# Altium footprint library 集大电协1.5.PcbLib: 227 footprints (part 10 of 18)
Each footprint in its own frame and in the unit in brackets; x right, y up, seen from the top. Pads: shape width x height; smd on the part's side, far side on the other; paste and mask are expansions set on the pad; w line width, h text height; cw(c..) or ccw(c..) is an arc to the next point about the centre after c.
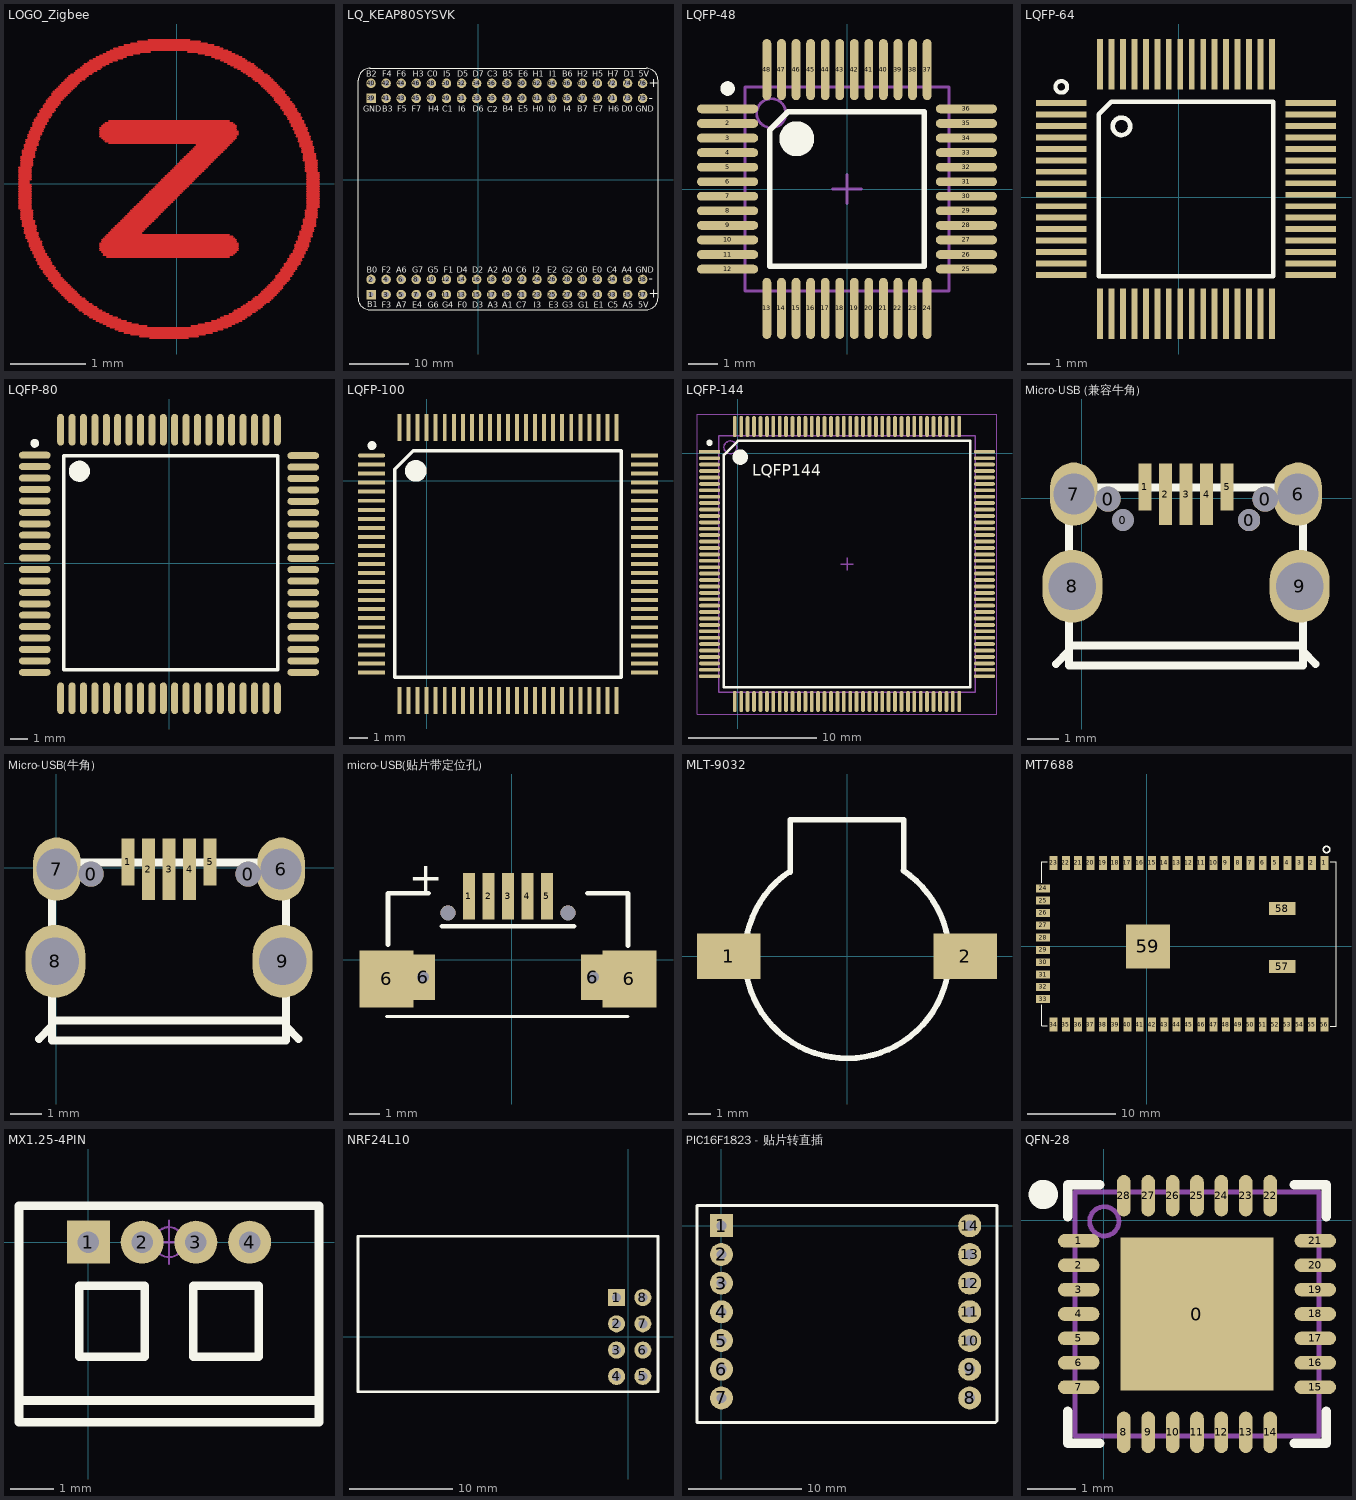
[diagram p9: the footprints below, top view; thin cyan lines are the x and y axes]

## LOGO_Zigbee [mm]
Top Layer:
  lines w0.023: -2.09,-0.33 -1.93,-0.33 ; -2.09,-0.307 -1.93,-0.307 ; -2.09,-0.284 -1.93,-0.284 ; -2.09,-0.262 -1.93,-0.262 ; -2.09,-0.239 -1.93,-0.239 ; -2.09,-0.216 -1.93,-0.216 ; -2.09,-0.193 -1.93,-0.193 ; -2.09,-0.17 -1.93,-0.17 ; -2.09,-0.147 -1.93,-0.147 ; -2.09,-0.124 -1.93,-0.124 ; -2.09,-0.102 -1.93,-0.102 ; -2.09,-0.079 -1.93,-0.079 ; -2.09,-0.056 -1.93,-0.056 ; -2.09,-0.033 -1.93,-0.033 ; -2.09,-0.01 -1.93,-0.01 ; -2.09,0.013 -1.953,0.013 ; -2.09,0.036 -1.953,0.036 ; -2.09,0.058 -1.93,0.058 ; -2.09,0.081 -1.93,0.081 ; -2.09,0.104 -1.93,0.104 ; -2.09,0.127 -1.93,0.127 ; -2.09,0.15 -1.93,0.15 ; -2.09,0.173 -1.93,0.173 ; -2.09,0.196 -1.93,0.196 ; -2.09,0.218 -1.93,0.218 ; -2.068,-0.467 -1.908,-0.467 ; -2.068,-0.445 -1.908,-0.445 ; -2.068,-0.422 -1.908,-0.422 ; -2.068,-0.399 -1.908,-0.399 ; -2.068,-0.376 -1.908,-0.376 ; -2.068,-0.353 -1.908,-0.353 ; -2.068,0.241 -1.908,0.241 ; -2.068,0.264 -1.908,0.264 ; -2.068,0.287 -1.908,0.287 ; -2.068,0.31 -1.908,0.31 ; -2.068,0.333 -1.908,0.333 ; -2.068,0.356 -1.885,0.356 ; -2.045,-0.559 -1.862,-0.559 ; -2.045,-0.536 -1.885,-0.536 ; -2.045,-0.513 -1.885,-0.513 ; -2.045,-0.49 -1.885,-0.49 ; -2.045,0.378 -1.885,0.378 ; -2.045,0.401 -1.885,0.401 ; -2.045,0.424 -1.885,0.424 ; -2.045,0.447 -1.862,0.447 ; -2.022,-0.65 -1.839,-0.65 ; -2.022,-0.627 -1.862,-0.627 ; -2.022,-0.605 -1.862,-0.605 ; -2.022,-0.582 -1.862,-0.582 ; -2.022,0.47 -1.862,0.47 ; -2.022,0.493 -1.862,0.493 ; -2.022,0.516 -1.839,0.516 ; -1.999,-0.719 -1.816,-0.719 ; -1.999,-0.696 -1.839,-0.696 ; -1.999,-0.673 -1.839,-0.673 ; -1.999,0.538 -1.839,0.538 ; -1.999,0.561 -1.839,0.561 ; -1.999,0.584 -1.816,0.584 ; -1.976,-0.765 -1.793,-0.765 ; -1.976,-0.742 -1.816,-0.742 ; -1.976,0.607 -1.816,0.607 ; -1.976,0.63 -1.816,0.63 ; -1.976,0.653 -1.793,0.653 ; -1.953,-0.833 -1.77,-0.833 ; -1.953,-0.81 -1.793,-0.81 ; -1.953,-0.787 -1.793,-0.787 ; -1.953,0.676 -1.793,0.676 ; -1.953,0.699 -1.77,0.699 ; -1.93,-0.879 -1.748,-0.879 ; -1.93,-0.856 -1.77,-0.856 ; -1.93,0.721 -1.77,0.721 ; -1.93,0.744 -1.748,0.744 ; -1.908,-0.925 -1.725,-0.925 ; -1.908,-0.902 -1.748,-0.902 ; -1.908,0.767 -1.748,0.767 ; -1.908,0.79 -1.725,0.79 ; -1.908,0.813 -1.725,0.813 ; -1.885,-0.97 -1.702,-0.97 ; -1.885,-0.947 -1.725,-0.947 ; -1.885,0.836 -1.702,0.836 ; -1.885,0.859 -1.702,0.859 ; -1.862,-1.016 -1.679,-1.016 ; -1.862,-0.993 -1.679,-0.993 ; -1.862,0.881 -1.679,0.881 ; -1.839,-1.062 -1.656,-1.062 ; -1.839,-1.039 -1.656,-1.039 ; -1.839,0.904 -1.656,0.904 ; -1.839,0.927 -1.656,0.927 ; -1.816,-1.107 -1.61,-1.107 ; -1.816,-1.085 -1.633,-1.085 ; -1.816,0.95 -1.633,0.95 ; -1.816,0.973 -1.61,0.973 ; -1.793,-1.13 -1.61,-1.13 ; -1.793,0.996 -1.61,0.996 ; -1.77,-1.176 -1.565,-1.176 ; -1.77,-1.153 -1.587,-1.153 ; -1.77,1.019 -1.587,1.019 ; -1.77,1.041 -1.565,1.041 ; -1.748,-1.199 -1.542,-1.199 ; -1.748,1.064 -1.542,1.064 ; -1.725,-1.222 -1.542,-1.222 ; -1.725,1.087 -1.542,1.087 ; -1.725,1.11 -1.519,1.11 ; -1.702,-1.267 -1.496,-1.267 ; -1.702,-1.245 -1.519,-1.245 ; -1.702,1.133 -1.496,1.133 ; -1.679,-1.29 -1.473,-1.29 ; -1.679,1.156 -1.473,1.156 ; -1.656,-1.313 -1.45,-1.313 ; -1.656,1.179 -1.45,1.179 ; -1.656,1.201 -1.427,1.201 ; -1.633,-1.359 -1.405,-1.359 ; -1.633,-1.336 -1.427,-1.336 ; -1.633,1.224 -1.405,1.224 ; -1.61,-1.382 -1.382,-1.382 ; -1.61,1.247 -1.382,1.247 ; -1.587,-1.405 -1.359,-1.405 ; -1.587,1.27 -1.359,1.27 ; -1.565,-1.427 -1.336,-1.427 ; -1.565,1.293 -1.336,1.293 ; -1.542,-1.45 -1.313,-1.45 ; -1.542,1.316 -1.313,1.316 ; -1.519,-1.473 -1.29,-1.473 ; -1.519,1.339 -1.29,1.339 ; -1.496,-1.496 -1.267,-1.496 ; -1.496,1.361 -1.267,1.361 ; -1.473,-1.519 -1.222,-1.519 ; -1.473,1.384 -1.222,1.384 ; -1.45,-1.542 -1.199,-1.542 ; -1.45,1.407 -1.199,1.407 ; -1.427,-1.565 -1.176,-1.565 ; -1.427,1.43 -1.176,1.43 ; -1.405,1.453 -1.13,1.453 ; -1.382,-1.587 -1.13,-1.587 ; -1.359,-1.61 -1.107,-1.61 ; -1.359,1.476 -1.107,1.476 ; -1.336,-1.633 -1.062,-1.633 ; -1.336,1.499 -1.062,1.499 ; -1.313,-1.656 -1.039,-1.656 ; -1.313,1.521 -1.016,1.521 ; -1.29,-1.679 -0.993,-1.679 ; -1.267,1.544 -0.993,1.544 ; -1.245,-1.702 -0.947,-1.702 ; -1.245,1.567 -0.947,1.567 ; -1.222,-1.725 -0.902,-1.725 ; -1.222,1.59 -0.902,1.59 ; -1.176,-1.748 -0.856,-1.748 ; -1.176,1.613 -0.856,1.613 ; -1.153,-1.77 -0.787,-1.77 ; -1.153,1.636 -0.787,1.636 ; -1.107,-1.793 -0.742,-1.793 ; -1.107,1.659 -0.719,1.659 ; -1.062,-1.816 -0.673,-1.816 ; -1.062,1.681 -0.673,1.681 ; -1.016,-1.839 -0.605,-1.839 ; -1.016,-0.879 0.813,-0.879 ; -1.016,-0.856 0.813,-0.856 ; -1.016,-0.833 0.813,-0.833 ; -1.016,-0.81 0.813,-0.81 ; -1.016,-0.787 0.813,-0.787 ; -1.016,0.63 0.79,0.63 ; -1.016,0.653 0.813,0.653 ; -1.016,0.676 0.813,0.676 ; -1.016,0.699 0.813,0.699 ; -1.016,0.721 0.79,0.721 ; -1.016,0.744 0.79,0.744 ; -1.016,1.704 -0.582,1.704 ; -0.993,-0.902 0.79,-0.902 ; -0.993,-0.765 0.79,-0.765 ; -0.993,-0.742 0.79,-0.742 ; -0.993,0.607 0.79,0.607 ; -0.993,0.767 0.79,0.767 ; -0.97,-1.862 -0.513,-1.862 ; -0.97,-0.947 0.744,-0.947 ; -0.97,-0.925 0.767,-0.925 ; -0.97,-0.719 0.767,-0.719 ; -0.97,0.584 0.767,0.584 ; -0.97,0.79 0.767,0.79 ; -0.97,1.727 -0.49,1.727 ; -0.947,-0.696 0.744,-0.696 ; -0.947,0.561 0.744,0.561 ; -0.947,0.813 0.744,0.813 ; -0.925,-1.885 -0.399,-1.885 ; -0.925,-0.97 0.699,-0.97 ; -0.925,-0.673 0.699,-0.673 ; -0.925,1.75 -0.353,1.75 ; -0.902,-0.65 -0.467,-0.65 ; -0.902,0.538 0.721,0.538 ; -0.902,0.836 0.699,0.836 ; -0.879,-1.908 0.676,-1.908 ; -0.879,-0.627 -0.445,-0.627 ; -0.879,1.773 0.676,1.773 ; -0.856,-0.605 -0.422,-0.605 ; -0.833,-0.582 -0.399,-0.582 ; -0.833,1.796 0.607,1.796 ; -0.81,-1.93 0.607,-1.93 ; -0.81,-0.559 -0.376,-0.559 ; -0.787,-0.536 -0.353,-0.536 ; -0.765,-1.953 0.538,-1.953 ; -0.765,-0.513 -0.33,-0.513 ; -0.765,1.819 0.561,1.819 ; -0.742,-0.49 -0.307,-0.49 ; -0.719,-0.467 -0.284,-0.467 ; -0.696,-1.976 0.47,-1.976 ; -0.696,-0.445 -0.262,-0.445 ; -0.696,1.841 0.493,1.841 ; -0.673,-0.422 -0.239,-0.422 ; -0.65,-0.399 -0.216,-0.399 ; -0.627,-0.376 -0.193,-0.376 ; -0.605,-1.999 0.378,-1.999 ; -0.605,-0.353 -0.17,-0.353 ; -0.605,1.864 0.401,1.864 ; -0.582,-0.33 -0.147,-0.33 ; -0.559,-0.307 -0.124,-0.307 ; -0.536,-0.284 -0.102,-0.284 ; -0.513,-0.262 -0.079,-0.262 ; -0.513,1.887 0.31,1.887 ; -0.49,-2.022 0.287,-2.022 ; -0.49,-0.239 -0.056,-0.239 ; -0.467,-0.216 -0.033,-0.216 ; -0.445,-0.193 -0.01,-0.193 ; -0.422,-0.17 0.013,-0.17 ; -0.399,-0.147 0.036,-0.147 ; -0.376,-0.124 0.058,-0.124 ; -0.376,1.91 0.173,1.91 ; -0.353,-2.045 0.15,-2.045 ; -0.353,-0.102 0.081,-0.102 ; -0.33,-0.079 0.104,-0.079 ; -0.307,-0.056 0.127,-0.056 ; -0.284,-0.033 0.15,-0.033 ; -0.262,-0.01 0.173,-0.01 ; -0.239,0.013 0.196,0.013 ; -0.216,0.036 0.218,0.036 ; -0.193,0.058 0.241,0.058 ; -0.17,0.081 0.264,0.081 ; -0.147,0.104 0.287,0.104 ; -0.124,0.127 0.31,0.127 ; -0.102,0.15 0.333,0.15 ; -0.079,0.173 0.356,0.173 ; -0.056,0.196 0.378,0.196 ; -0.033,0.218 0.401,0.218 ; -0.01,0.241 0.424,0.241 ; 0.013,0.264 0.447,0.264 ; 0.036,0.287 0.47,0.287 ; 0.058,0.31 0.493,0.31 ; 0.081,0.333 0.516,0.333 ; 0.104,0.356 0.538,0.356 ; 0.127,0.378 0.561,0.378 ; 0.15,0.401 0.584,0.401 ; 0.15,1.75 0.721,1.75 ; 0.173,0.424 0.607,0.424 ; 0.196,-1.885 0.721,-1.885 ; 0.196,0.447 0.63,0.447 ; 0.218,0.47 0.653,0.47 ; 0.241,0.493 0.676,0.493 ; 0.264,0.516 0.699,0.516 ; 0.287,-1.862 0.767,-1.862 ; 0.287,1.727 0.767,1.727 ; 0.378,-1.839 0.813,-1.839 ; 0.378,1.704 0.813,1.704 ; 0.47,-1.816 0.859,-1.816 ; 0.47,1.681 0.859,1.681 ; 0.516,1.659 0.904,1.659 ; 0.538,-1.793 0.904,-1.793 ; 0.584,-1.77 0.927,-1.77 ; 0.584,1.636 0.927,1.636 ; 0.63,-1.748 0.973,-1.748 ; 0.63,1.613 0.973,1.613 ; 0.676,1.59 1.019,1.59 ; 0.699,-1.725 0.996,-1.725 ; 0.721,1.567 1.041,1.567 ; 0.744,-1.702 1.041,-1.702 ; 0.767,-1.679 1.064,-1.679 ; 0.767,1.544 1.064,1.544 ; 0.813,-1.656 1.11,-1.656 ; 0.813,1.521 1.11,1.521 ; 0.859,-1.633 1.133,-1.633 ; 0.859,1.499 1.133,1.499 ; 0.881,-1.61 1.156,-1.61 ; 0.881,1.476 1.156,1.476 ; 0.927,-1.587 1.179,-1.587 ; 0.927,1.453 1.201,1.453 ; 0.95,-1.565 1.224,-1.565 ; 0.95,1.43 1.224,1.43 ; 0.996,-1.542 1.247,-1.542 ; 0.996,1.407 1.247,1.407 ; 1.019,-1.519 1.27,-1.519 ; 1.019,1.384 1.27,1.384 ; 1.041,-1.496 1.293,-1.496 ; 1.041,1.361 1.293,1.361 ; 1.087,-1.473 1.316,-1.473 ; 1.087,1.339 1.316,1.339 ; 1.11,-1.45 1.339,-1.45 ; 1.11,1.316 1.339,1.316 ; 1.133,-1.427 1.361,-1.427 ; 1.133,1.293 1.361,1.293 ; 1.156,-1.405 1.384,-1.405 ; 1.156,1.27 1.384,1.27 ; 1.179,-1.382 1.407,-1.382 ; 1.179,1.247 1.407,1.247 ; 1.201,-1.359 1.407,-1.359 ; 1.201,1.224 1.43,1.224 ; 1.224,-1.336 1.43,-1.336 ; 1.224,1.201 1.43,1.201 ; 1.247,-1.313 1.453,-1.313 ; 1.247,1.179 1.453,1.179 ; 1.27,-1.29 1.476,-1.29 ; 1.27,1.156 1.476,1.156 ; 1.293,-1.267 1.499,-1.267 ; 1.293,1.11 1.499,1.11 ; 1.293,1.133 1.499,1.133 ; 1.316,-1.245 1.499,-1.245 ; 1.316,-1.222 1.521,-1.222 ; 1.316,1.087 1.521,1.087 ; 1.339,-1.199 1.544,-1.199 ; 1.339,1.064 1.544,1.064 ; 1.361,-1.176 1.544,-1.176 ; 1.361,1.041 1.567,1.041 ; 1.384,-1.153 1.567,-1.153 ; 1.384,-1.13 1.59,-1.13 ; 1.384,0.996 1.59,0.996 ; 1.384,1.019 1.567,1.019 ; 1.407,-1.107 1.59,-1.107 ; 1.407,0.973 1.59,0.973 ; 1.43,-1.085 1.613,-1.085 ; 1.43,-1.062 1.636,-1.062 ; 1.43,0.927 1.636,0.927 ; 1.43,0.95 1.613,0.95 ; 1.453,-1.039 1.636,-1.039 ; 1.453,0.904 1.636,0.904 ; 1.476,-1.016 1.659,-1.016 ; 1.476,-0.993 1.659,-0.993 ; 1.476,0.859 1.659,0.859 ; 1.476,0.881 1.659,0.881 ; 1.499,-0.97 1.681,-0.97 ; 1.499,-0.947 1.681,-0.947 ; 1.499,0.813 1.681,0.813 ; 1.499,0.836 1.681,0.836 ; 1.521,-0.925 1.704,-0.925 ; 1.521,0.767 1.704,0.767 ; 1.521,0.79 1.704,0.79 ; 1.544,-0.902 1.704,-0.902 ; 1.544,-0.879 1.727,-0.879 ; 1.544,0.721 1.727,0.721 ; 1.544,0.744 1.727,0.744 ; 1.567,-0.856 1.727,-0.856 ; 1.567,-0.833 1.75,-0.833 ; 1.567,-0.81 1.75,-0.81 ; 1.567,0.676 1.75,0.676 ; 1.567,0.699 1.727,0.699 ; 1.59,-0.787 1.75,-0.787 ; 1.59,-0.765 1.773,-0.765 ; 1.59,0.63 1.773,0.63 ; 1.59,0.653 1.75,0.653 ; 1.613,-0.742 1.773,-0.742 ; 1.613,-0.719 1.773,-0.719 ; 1.613,-0.696 1.796,-0.696 ; 1.613,0.561 1.796,0.561 ; 1.613,0.584 1.773,0.584 ; 1.613,0.607 1.773,0.607 ; 1.636,-0.673 1.796,-0.673 ; 1.636,-0.65 1.796,-0.65 ; 1.636,-0.627 1.819,-0.627 ; 1.636,0.493 1.819,0.493 ; 1.636,0.516 1.796,0.516 ; 1.636,0.538 1.796,0.538 ; 1.659,-0.605 1.819,-0.605 ; 1.659,-0.582 1.819,-0.582 ; 1.659,-0.559 1.841,-0.559 ; 1.659,0.424 1.819,0.424 ; 1.659,0.447 1.819,0.447 ; 1.659,0.47 1.819,0.47 ; 1.681,-0.536 1.841,-0.536 ; 1.681,-0.513 1.841,-0.513 ; 1.681,-0.49 1.841,-0.49 ; 1.681,-0.467 1.841,-0.467 ; 1.681,0.31 1.864,0.31 ; 1.681,0.333 1.841,0.333 ; 1.681,0.356 1.841,0.356 ; 1.681,0.378 1.841,0.378 ; 1.681,0.401 1.841,0.401 ; 1.704,-0.445 1.864,-0.445 ; 1.704,-0.422 1.864,-0.422 ; 1.704,-0.399 1.864,-0.399 ; 1.704,-0.376 1.864,-0.376 ; 1.704,-0.353 1.864,-0.353 ; 1.704,0.173 1.864,0.173 ; 1.704,0.196 1.864,0.196 ; 1.704,0.218 1.864,0.218 ; 1.704,0.241 1.864,0.241 ; 1.704,0.264 1.864,0.264 ; 1.704,0.287 1.864,0.287 ; 1.727,-0.33 1.864,-0.33 ; 1.727,-0.307 1.887,-0.307 ; 1.727,-0.284 1.887,-0.284 ; 1.727,-0.262 1.887,-0.262 ; 1.727,-0.239 1.887,-0.239 ; 1.727,-0.216 1.887,-0.216 ; 1.727,-0.193 1.887,-0.193 ; 1.727,-0.17 1.887,-0.17 ; 1.727,-0.147 1.887,-0.147 ; 1.727,-0.124 1.887,-0.124 ; 1.727,-0.102 1.887,-0.102 ; 1.727,-0.079 1.887,-0.079 ; 1.727,-0.056 1.887,-0.056 ; 1.727,-0.033 1.887,-0.033 ; 1.727,-0.01 1.887,-0.01 ; 1.727,0.013 1.887,0.013 ; 1.727,0.036 1.887,0.036 ; 1.727,0.058 1.887,0.058 ; 1.727,0.081 1.887,0.081 ; 1.727,0.104 1.887,0.104 ; 1.727,0.127 1.887,0.127 ; 1.727,0.15 1.887,0.15

## LQ_KEAP80SYSVK [mm]
pads (76):
  rect 1.6x1.6 hole 0.9: 1(-18.016,-19.342) 39(-18.016,13.678)
  round 1.6 hole 0.9: 2(-18.016,-16.802) 3(-15.476,-19.342) 4(-15.476,-16.802) 5(-12.936,-19.342) 6(-12.936,-16.802) 7(-10.396,-19.342) 8(-10.396,-16.802) 9(-7.856,-19.342) 10(-7.856,-16.802) 11(-5.316,-19.342) 12(-5.316,-16.802) 13(-2.776,-19.342) 14(-2.776,-16.802) 15(-0.236,-19.342) 16(-0.236,-16.802) 17(2.304,-19.342) 18(2.304,-16.802) 19(4.844,-19.342) 20(4.844,-16.802) 21(7.384,-19.342) 22(7.384,-16.802) 23(9.924,-19.342) 24(9.924,-16.802) 25(12.464,-19.342) 26(12.464,-16.802) 27(15.004,-19.342) 28(15.004,-16.802) 29(17.544,-19.342) 30(17.544,-16.802) 31(20.084,-19.342) 32(20.084,-16.802) 33(22.624,-19.342) 34(22.624,-16.802) 35(25.164,-19.342) 36(25.164,-16.802) 37(27.704,-19.342) 38(27.704,-16.802) 40(-18.016,16.218) 41(-15.476,13.678) 42(-15.476,16.218) 43(-12.936,13.678) 44(-12.936,16.218) 45(-10.396,13.678) 46(-10.396,16.218) 47(-7.856,13.678) 48(-7.856,16.218) 49(-5.316,13.678) 50(-5.316,16.218) 51(-2.776,13.678) 52(-2.776,16.218) 53(-0.236,13.678) 54(-0.236,16.218) 55(2.304,13.678) 56(2.304,16.218) 57(4.844,13.678) 58(4.844,16.218) 59(7.384,13.678) 60(7.384,16.218) 61(9.924,13.678) 62(9.924,16.218) 63(12.464,13.678) 64(12.464,16.218) 65(15.004,13.678) 66(15.004,16.218) 67(17.544,13.678) 68(17.544,16.218) 69(20.084,13.678) 70(20.084,16.218) 71(22.624,13.678) 72(22.624,16.218) 73(25.164,13.678) 74(25.164,16.218) 75(27.704,13.678) 76(27.704,16.218)
Top Overlay:
  lines w0.2: -20.208,16.739 -20.208,-19.905 ccw(c-18.208,-19.905) -18.208,-21.905 28.292,-21.905 ccw(c28.292,-19.905) 30.292,-19.905 30.292,16.739 ccw(c28.292,16.739) 28.292,18.739 -18.208,18.739 ; -20.158,16.749 cw(c-18.158,16.749) -18.158,18.749
  text "B1" at -18.618,-21.521 h1
  text "B2" at -18.788,17.289 h1
  text "F4" at -16.148,17.289 h1
  text "F6" at -13.708,17.289 h1
  text "H3" at -10.988,17.289 h1
  text "C0" at -8.568,17.289 h1
  text "I5" at -5.878,17.319 h1
  text "D5" at -3.488,17.289 h1
  text "D7" at -0.878,17.289 h1
  text "B5" at 4.142,17.289 h1
  text "E6" at 6.772,17.289 h1
  text "H1" at 9.232,17.289 h1
  text "I1" at 11.962,17.289 h1
  text "B6" at 14.192,17.289 h1
  text "H5" at 19.252,17.289 h1
  text "H7" at 21.872,17.289 h1
  text "D1" at 24.532,17.289 h1
  text "5V" at 27.052,17.289 h1
  text "GND" at -19.328,11.429 h1
  text "B3" at -16.128,11.399 h1
  text "F5" at -13.568,11.389 h1
  text "F7" at -11.138,11.389 h1
  text "H4" at -8.408,11.399 h1
  text "C1" at -5.988,11.399 h1
  text "I6" at -3.308,11.429 h1
  text "D6" at -0.858,11.399 h1
  text "C2" at 1.552,11.379 h1
  text "B4" at 4.162,11.399 h1
  text "E5" at 6.772,11.389 h1
  text "H0" at 9.222,11.399 h1
  text "I0" at 11.872,11.389 h1
  text "I4" at 14.442,11.389 h1
  text "B7" at 16.722,11.399 h1
  text "E7" at 19.392,11.389 h1
  text "H6" at 21.952,11.399 h1
  text "D0" at 24.192,11.399 h1
  text "GND" at 26.512,11.399 h1
  text "B0" at -18.758,-15.641 h1
  text "F2" at -16.208,-15.641 h1
  text "A6" at -13.768,-15.641 h1
  text "G7" at -11.048,-15.641 h1
  text "G5" at -8.488,-15.641 h1
  text "F1" at -5.798,-15.641 h1
  text "D4" at -3.548,-15.641 h1
  text "D2" at -0.938,-15.641 h1
  text "A2" at 1.602,-15.641 h1
  text "A0" at 4.082,-15.641 h1
  text "C6" at 6.472,-15.641 h1
  text "I2" at 9.212,-15.641 h1
  text "E2" at 11.642,-15.641 h1
  text "G2" at 14.132,-15.641 h1
  text "G0" at 16.642,-15.641 h1
  text "E0" at 19.192,-15.641 h1
  text "C4" at 21.652,-15.641 h1
  text "A4" at 24.212,-15.641 h1
  text "GND" at 26.532,-15.641 h1
  text "F3" at -16.208,-21.561 h1
  text "A7" at -13.768,-21.561 h1
  text "E4" at -11.048,-21.561 h1
  text "G6" at -8.488,-21.561 h1
  text "G4" at -6.068,-21.561 h1
  text "F0" at -3.428,-21.561 h1
  text "D3" at -0.938,-21.561 h1
  text "A3" at 1.602,-21.561 h1
  text "A1" at 4.082,-21.561 h1
  text "C7" at 6.472,-21.561 h1
  text "I3" at 9.352,-21.561 h1
  text "E3" at 11.882,-21.551 h1
  text "G3" at 14.132,-21.561 h1
  text "G1" at 16.902,-21.561 h1
  text "E1" at 19.482,-21.551 h1
  text "C5" at 21.822,-21.561 h1
  text "A5" at 24.322,-21.561 h1
  text "5V" at 26.992,-21.561 h1
  text "H2" at 16.702,17.289 h1
  text "C3" at 1.522,17.289 h1
  text "+" at 28.762,15.579 h1.5
  text "-" at 28.752,-17.401 h1.5
  text "+" at 28.742,-19.901 h1.5
  text "-" at 28.752,13.039 h1.5

## LQFP-48 [mm]
pads (48):
  oval 2.1x0.3 smd: 1(-4.1,2.75) 2(-4.1,2.25) 3(-4.1,1.75) 4(-4.1,1.25) 5(-4.1,0.75) 6(-4.1,0.25) 7(-4.1,-0.25) 8(-4.1,-0.75) 9(-4.1,-1.25) 10(-4.1,-1.75) 11(-4.1,-2.25) 12(-4.1,-2.75) 25(4.1,-2.75) 26(4.1,-2.25) 27(4.1,-1.75) 28(4.1,-1.25) 29(4.1,-0.75) 30(4.1,-0.25) 31(4.1,0.25) 32(4.1,0.75) 33(4.1,1.25) 34(4.1,1.75) 35(4.1,2.25) 36(4.1,2.75)
  oval 0.3x2.1 smd: 13(-2.75,-4.1) 14(-2.25,-4.1) 15(-1.75,-4.1) 16(-1.25,-4.1) 17(-0.75,-4.1) 18(-0.25,-4.1) 19(0.25,-4.1) 20(0.75,-4.1) 21(1.25,-4.1) 22(1.75,-4.1) 23(2.25,-4.1) 24(2.75,-4.1) 37(2.75,4.1) 38(2.25,4.1) 39(1.75,4.1) 40(1.25,4.1) 41(0.75,4.1) 42(0.25,4.1) 43(-0.25,4.1) 44(-0.75,4.1) 45(-1.25,4.1) 46(-1.75,4.1) 47(-2.25,4.1) 48(-2.75,4.1)
Top Overlay:
  circle w0.6: c-1.725,1.725 r0.3
  circle w0.25: c-4.1,3.45 r0.125
  lines w0.2: -2.65,-2.65 -2.65,2.025 -2.025,2.65 2.65,2.65 2.65,-2.65 -2.65,-2.65
Mechanical 13:
  circle w0.1: c-2.6,2.6 r0.5
  lines w0.1: -3.5,-3.5 3.5,-3.5 3.5,3.5 -3.5,3.5 -3.5,-3.5
Mechanical 15:
  lines w0.1: -0.5,0 0.5,0 ; 0,-0.5 0,0.5

## LQFP-64 [mil]
pads (64):
  rect 86.61x10 smd: 1(-202,162) 2(-202,142.31) 3(-202,122.63) 4(-202,102.94) 5(-202,83.26) 6(-202,63.58) 7(-202,43.89) 8(-202,24.21) 9(-202,4.52) 10(-202,-15.17) 11(-202,-34.85) 12(-202,-54.54) 13(-202,-74.22) 14(-202,-93.91) 15(-202,-113.59) 16(-202,-133.27) 33(227.13,-133.27) 34(227.13,-113.59) 35(227.13,-93.9) 36(227.13,-74.22) 37(227.13,-54.54) 38(227.13,-34.85) 39(227.13,-15.17) 40(227.13,4.52) 41(227.13,24.21) 42(227.13,43.89) 43(227.13,63.58) 44(227.13,83.26) 45(227.13,102.95) 46(227.13,122.63) 47(227.13,142.31) 48(227.13,162)
  rect 10x86.61 smd: 17(-135.07,-200.2) 18(-115.39,-200.2) 19(-95.7,-200.21) 20(-76.02,-200.2) 21(-56.33,-200.2) 22(-36.65,-200.2) 23(-16.96,-200.21) 24(2.72,-200.2) 25(22.41,-200.2) 26(42.09,-200.21) 27(61.78,-200.2) 28(81.46,-200.2) 29(101.15,-200.21) 30(120.83,-200.2) 31(140.52,-200.2) 32(160.21,-200.2) 49(160.2,228.93) 50(140.52,228.93) 51(120.83,228.93) 52(101.15,228.93) 53(81.46,228.93) 54(61.78,228.93) 55(42.09,228.93) 56(22.41,228.93) 57(2.72,228.93) 58(-16.96,228.93) 59(-36.65,228.93) 60(-56.33,228.93) 61(-76.02,228.93) 62(-95.7,228.93) 63(-115.39,228.93) 64(-135.07,228.93)
Top Overlay:
  circle w7: c-201.77,189.96 r10
  circle w7.87: c-98.43,122.05 r15
  lines w7.87: -137.63,-135.83 -137.63,142.88 -115.95,164.56 162.76,164.56 162.76,-135.83 -137.63,-135.83
3D body "User Library-LQFP-64-1.STEP": height 59.06, standoff 0, extent -224.66,-221.22 247.78,251.22

## LQFP-80 [mm]
pads (80):
  oval 1.8x0.4 smd: 1(-7.66,6.149) 2(-7.66,5.497) 3(-7.66,4.846) 4(-7.66,4.195) 5(-7.66,3.543) 6(-7.66,2.892) 7(-7.66,2.24) 8(-7.66,1.589) 9(-7.66,0.937) 10(-7.66,0.286) 11(-7.66,-0.365) 12(-7.66,-1.017) 13(-7.66,-1.668) 14(-7.66,-2.32) 15(-7.66,-2.971) 16(-7.66,-3.623) 17(-7.66,-4.274) 18(-7.66,-4.925) 19(-7.66,-5.577) 20(-7.66,-6.228) 41(7.64,-6.228) 42(7.64,-5.578) 43(7.64,-4.928) 44(7.64,-4.278) 45(7.64,-3.628) 46(7.64,-2.978) 47(7.64,-2.328) 48(7.64,-1.678) 49(7.64,-1.028) 50(7.64,-0.378) 51(7.64,0.272) 52(7.64,0.922) 53(7.64,1.572) 54(7.64,2.222) 55(7.64,2.872) 56(7.64,3.522) 57(7.64,4.172) 58(7.64,4.822) 59(7.64,5.472) 60(7.64,6.122)
  oval 0.4x1.8 smd: 21(-6.185,-7.703) 22(-5.535,-7.703) 23(-4.885,-7.703) 24(-4.235,-7.703) 25(-3.585,-7.703) 26(-2.935,-7.703) 27(-2.285,-7.703) 28(-1.635,-7.703) 29(-0.985,-7.703) 30(-0.335,-7.703) 31(0.315,-7.703) 32(0.965,-7.703) 33(1.615,-7.703) 34(2.265,-7.703) 35(2.915,-7.703) 36(3.565,-7.703) 37(4.215,-7.703) 38(4.865,-7.703) 39(5.515,-7.703) 40(6.165,-7.703) 61(6.165,7.597) 62(5.515,7.597) 63(4.865,7.597) 64(4.215,7.597) 65(3.565,7.597) 66(2.915,7.597) 67(2.265,7.597) 68(1.615,7.597) 69(0.965,7.597) 70(0.315,7.597) 71(-0.335,7.597) 72(-0.985,7.597) 73(-1.635,7.597) 74(-2.285,7.597) 75(-2.935,7.597) 76(-3.585,7.597) 77(-4.235,7.597) 78(-4.885,7.597) 79(-5.535,7.597) 80(-6.185,7.597)
Top Overlay:
  circle w0.6: c-5.12,5.233 r0.3
  circle w0.25: c-7.66,6.822 r0.125
  lines w0.2: -6.009,-6.07 6.183,-6.07 6.183,6.122 -6.009,6.122 -6.009,-6.07
3D body "User Library-QFP50P1400X1400X160-80N.STEP": height 1.6, standoff 0, extent -7.024,-6.828 7.176,7.372

## LQFP-100 [mm]
pads (100):
  oval 1.5x0.22 smd: 1(-3.048,1.397)
  rect 1.5x0.22 smd: 2(-3.048,0.897) 3(-3.048,0.397) 4(-3.048,-0.103) 5(-3.048,-0.603) 6(-3.048,-1.103) 7(-3.048,-1.603) 8(-3.048,-2.103) 9(-3.048,-2.603) 10(-3.048,-3.103) 11(-3.048,-3.603) 12(-3.048,-4.103) 13(-3.048,-4.603) 14(-3.048,-5.103) 15(-3.048,-5.603) 16(-3.048,-6.103) 17(-3.048,-6.603) 18(-3.048,-7.103) 19(-3.048,-7.603) 20(-3.048,-8.103) 21(-3.048,-8.603) 22(-3.048,-9.103) 23(-3.048,-9.603) 24(-3.048,-10.103) 25(-3.048,-10.603) 51(12.05,-10.603) 52(12.05,-10.103) 53(12.05,-9.603) 54(12.05,-9.103) 55(12.05,-8.603) 56(12.05,-8.103) 57(12.05,-7.603) 58(12.05,-7.103) 59(12.05,-6.603) 60(12.05,-6.103) 61(12.05,-5.603) 62(12.05,-5.103) 63(12.05,-4.603) 64(12.05,-4.103) 65(12.05,-3.603) 66(12.05,-3.103) 67(12.05,-2.603) 68(12.05,-2.103) 69(12.05,-1.603) 70(12.05,-1.103) 71(12.05,-0.603) 72(12.05,-0.103) 73(12.05,0.397) 74(12.05,0.897) 75(12.05,1.397)
  rect 0.22x1.5 smd: 26(-1.499,-12.152) 27(-0.999,-12.152) 28(-0.499,-12.152) 29(0.001,-12.152) 30(0.501,-12.152) 31(1.001,-12.152) 32(1.501,-12.152) 33(2.001,-12.152) 34(2.501,-12.152) 35(3.001,-12.152) 36(3.501,-12.152) 37(4.001,-12.152) 38(4.501,-12.152) 39(5.001,-12.152) 40(5.501,-12.152) 41(6.001,-12.152) 42(6.501,-12.152) 43(7.001,-12.152) 44(7.501,-12.152) 45(8.001,-12.152) 46(8.501,-12.152) 47(9.001,-12.152) 48(9.501,-12.152) 49(10.001,-12.152) 50(10.501,-12.152) 76(10.501,2.946) 77(10.001,2.946) 78(9.501,2.946) 79(9.001,2.946) 80(8.501,2.946) 81(8.001,2.946) 82(7.501,2.946) 83(7.001,2.946) 84(6.501,2.946) 85(6.001,2.946) 86(5.501,2.946) 87(5.001,2.946) 88(4.501,2.946) 89(4.001,2.946) 90(3.501,2.946) 91(3.001,2.946) 92(2.501,2.946) 93(2.001,2.946) 94(1.501,2.946) 95(1.001,2.946) 96(0.501,2.946) 97(0.001,2.946) 98(-0.499,2.946) 99(-0.999,2.946) 100(-1.499,2.946)
Top Overlay:
  circle w0.6: c-0.6,0.55 r0.3
  circle w0.25: c-3.025,1.95 r0.125
  lines w0.2: -1.763,-10.867 -1.763,0.637 -0.739,1.661 10.765,1.661 10.765,-10.867 -1.763,-10.867
3D body "User Library-LQFP.STEP": height 1.65, standoff -0.06, extent -3.503,-12.598 12.497,3.402

## LQFP-144 [mm]
pads (144):
  rect 1.651x0.3 smd: 1(-2.199,0.11)
  oval 1.651x0.3 smd: 2(-2.199,-0.39) 3(-2.199,-0.89) 4(-2.199,-1.39) 5(-2.199,-1.89) 6(-2.199,-2.39) 7(-2.199,-2.89) 8(-2.199,-3.39) 9(-2.199,-3.89) 10(-2.199,-4.39) 11(-2.199,-4.89) 12(-2.199,-5.39) 13(-2.199,-5.89) 14(-2.199,-6.39) 15(-2.199,-6.89) 16(-2.199,-7.39) 17(-2.199,-7.89) 18(-2.199,-8.39) 19(-2.199,-8.89) 20(-2.199,-9.39) 21(-2.199,-9.89) 22(-2.199,-10.39) 23(-2.199,-10.89) 24(-2.199,-11.39) 25(-2.199,-11.89) 26(-2.199,-12.39) 27(-2.199,-12.89) 28(-2.199,-13.39) 29(-2.199,-13.89) 30(-2.199,-14.39) 31(-2.199,-14.89) 32(-2.199,-15.39) 33(-2.199,-15.89) 34(-2.199,-16.39) 35(-2.199,-16.89) 36(-2.199,-17.39) 73(19.251,-17.39) 74(19.251,-16.89) 75(19.251,-16.39) 76(19.251,-15.89) 77(19.251,-15.39) 78(19.251,-14.89) 79(19.251,-14.39) 80(19.251,-13.89) 81(19.251,-13.39) 82(19.251,-12.89) 83(19.251,-12.39) 84(19.251,-11.89) 85(19.251,-11.39) 86(19.251,-10.89) 87(19.251,-10.39) 88(19.251,-9.89) 89(19.251,-9.39) 90(19.251,-8.89) 91(19.251,-8.39) 92(19.251,-7.89) 93(19.251,-7.39) 94(19.251,-6.89) 95(19.251,-6.39) 96(19.251,-5.89) 97(19.251,-5.39) 98(19.251,-4.89) 99(19.251,-4.39) 100(19.251,-3.89) 101(19.251,-3.39) 102(19.251,-2.89) 103(19.251,-2.39) 104(19.251,-1.89) 105(19.251,-1.39) 106(19.251,-0.89) 107(19.251,-0.39) 108(19.251,0.11)
  oval 0.3x1.651 smd: 37(-0.224,-19.365) 38(0.276,-19.365) 39(0.776,-19.365) 40(1.276,-19.365) 41(1.776,-19.365) 42(2.276,-19.365) 43(2.776,-19.365) 44(3.276,-19.365) 45(3.776,-19.365) 46(4.276,-19.365) 47(4.776,-19.365) 48(5.276,-19.365) 49(5.776,-19.365) 50(6.276,-19.365) 51(6.776,-19.365) 52(7.276,-19.365) 53(7.776,-19.365) 54(8.276,-19.365) 55(8.776,-19.365) 56(9.276,-19.365) 57(9.776,-19.365) 58(10.276,-19.365) 59(10.776,-19.365) 60(11.276,-19.365) 61(11.776,-19.365) 62(12.276,-19.365) 63(12.776,-19.365) 64(13.276,-19.365) 65(13.776,-19.365) 66(14.276,-19.365) 67(14.776,-19.365) 68(15.276,-19.365) 69(15.776,-19.365) 70(16.276,-19.365) 71(16.776,-19.365) 72(17.276,-19.365) 109(17.276,2.085) 110(16.776,2.085) 111(16.276,2.085) 112(15.776,2.085) 113(15.276,2.085) 114(14.776,2.085) 115(14.276,2.085) 116(13.776,2.085) 117(13.276,2.085) 118(12.776,2.085) 119(12.276,2.085) 120(11.776,2.085) 121(11.276,2.085) 122(10.776,2.085) 123(10.276,2.085) 124(9.776,2.085) 125(9.276,2.085) 126(8.776,2.085) 127(8.276,2.085) 128(7.776,2.085) 129(7.276,2.085) 130(6.776,2.085) 131(6.276,2.085) 132(5.776,2.085) 133(5.276,2.085) 134(4.776,2.085) 135(4.276,2.085) 136(3.776,2.085) 137(3.276,2.085) 138(2.776,2.085) 139(2.276,2.085) 140(1.776,2.085) 141(1.276,2.085) 142(0.776,2.085) 143(0.276,2.085) 144(-0.224,2.085)
Top Overlay:
  circle w0.6: c0.2,-0.3 r0.3
  circle w0.25: c-2.199,0.81 r0.125
  lines w0.2: -1.074,-18.24 -1.074,-0.124 0.01,0.96 18.126,0.96 18.126,-18.24 -1.074,-18.24
  text "LQFP144" at 1.125,-2.05 h1.52
Mechanical 13:
  circle w0.1: c-0.574,0.46 r0.5
  lines w0.1: -1.474,-18.64 18.526,-18.64 18.526,1.36 -1.474,1.36 -1.474,-18.64
Mechanical 15:
  lines w0.05: -3.174,-20.34 20.226,-20.34 20.226,3.06 -3.174,3.06 -3.174,-20.34
  lines w0.1: 8.026,-8.64 9.026,-8.64 ; 8.526,-9.14 8.526,-8.14
3D body "TSQFP50P2200X2200X160-144N.step": height 1.6, standoff 0, extent -2.474,-19.64 19.526,2.36

## Micro-USB (兼容牛角) [mm]
pads (13):
  round 0.8 hole 0.8: 0(0.825,-0.025) 0(5.8,-0.025)
  oval 0.47x0.7 hole 0.7: 0(1.294,-0.69)
  round 0.7 hole 0.7: 0(5.294,-0.69)
  rect 0.4x1.5 smd: 1(1.994,0.359) 5(4.594,0.359)
  rect 0.4x1.95 smd: 2(2.644,0.135) 3(3.294,0.135) 4(3.944,0.135)
  oval 1.5x2 hole 1.3: 6(6.844,0.135) 7(-0.256,0.135)
  oval 1.9x2.3 hole 1.5: 8(-0.306,-2.786) 9(6.894,-2.786)
Top Overlay:
  lines w0.254: -0.83,-5.253 -0.406,-4.83 -0.406,-4.665 ; -0.414,-5.295 -0.406,-5.295 ; 7.4,-5.253 6.994,-4.847 6.994,-4.665 ; -0.406,-5.295 -0.406,-4.665 ; -0.406,-5.295 6.994,-5.295 6.994,-4.665 ; -0.406,-4.665 -0.406,0.335 6.994,0.335 6.994,-4.665 ; -0.406,-4.665 6.994,-4.665
3D body "User Library-MicroUSB-B_Molex_105017-0001.STEP": height 0.23, standoff -3.08, extent -0.776,-5.338 7.424,0.092

## Micro-USB(牛角) [mm]
pads (11):
  round 0.8 hole 0.8: 0(1.1,-0.2) 0(6.075,-0.2)
  rect 0.4x1.5 smd: 1(2.269,0.184) 5(4.869,0.184)
  rect 0.4x1.95 smd: 2(2.919,-0.04) 3(3.569,-0.04) 4(4.219,-0.04)
  oval 1.5x2 hole 1.3: 6(7.119,-0.04) 7(0.019,-0.04)
  oval 1.9x2.3 hole 1.5: 8(-0.031,-2.961) 9(7.169,-2.961)
Top Overlay:
  lines w0.254: -0.555,-5.428 -0.131,-5.005 -0.131,-4.84 ; -0.139,-5.47 -0.131,-5.47 ; 7.675,-5.428 7.269,-5.022 7.269,-4.84 ; -0.131,-5.47 -0.131,-4.84 ; -0.131,-5.47 7.269,-5.47 7.269,-4.84 ; -0.131,-4.84 -0.131,0.16 7.269,0.16 7.269,-4.84 ; -0.131,-4.84 7.269,-4.84
3D body "User Library-MicroUSB-B_Molex_105017-0001.STEP": height 0.23, standoff -3.08, extent -0.501,-5.513 7.699,-0.083

## micro-USB(贴片带定位孔) [mm]
pads (11):
  rect 0.4x1.55 smd: 1(-1.423,2.116) 2(-0.773,2.116) 3(-0.123,2.116) 4(0.527,2.116) 5(1.177,2.116)
  rect 1.8x1.9 smd: 6(-4.173,-0.634) 6(3.927,-0.634)
  rect 0.8x1.5 hole 0.4: 6(-2.948,-0.584) 6(2.702,-0.584)
  round 0.5 hole 0.5 unplated: ""(-2.123,1.566) ""(1.877,1.566)
Top Overlay:
  lines w0.1: -4.173,-1.884 3.877,-1.884
  lines w0.152: -4.123,0.5 -4.123,2.216 -2.773,2.216 ; -2.323,1.116 2.077,1.116 ; 2.527,2.216 3.877,2.216 3.877,0.466
  text "+" at -3.423,2.266 h1
Keep-Out Layer:
  lines w0.127: -3.177,-1.127 -3.177,-0.009 -2.719,-0.009 -2.719,-1.127 -3.177,-1.127 ; 2.473,-1.127 2.931,-1.127 2.931,-0.009 2.473,-0.009 2.473,-1.127
Mechanical 1:
  lines w0.127: -3.177,-1.127 -2.719,-1.127 -2.719,-0.009 -3.177,-0.009 -3.177,-1.127 ; 2.473,-1.127 2.931,-1.127 2.931,-0.009 2.473,-0.009 2.473,-1.127
3D body "MICRO-USB.stp": height 2.47, standoff -0.92, extent -4.075,-2.7 3.875,3.076

## MLT-9032 [mm]
pads (2):
  rect 2.8x2 smd: 1(-5.2,0) 2(5.2,0)
Top Overlay:
  lines w0.254: -2.541,3.714 ccw(c0,0) 2.473,3.759 ; -2.5,3.7 -2.5,6 2.5,6 2.5,3.8
3D body "User Library-CEP2242_Buzzer.STEP": height 7.59, standoff -5.5, extent -6.832,-5.942 6.859,7.749

## MT7688 [mm] "MT7688模组"
pads (59):
  rect 0.9x1.6 smd: 1(20.2,9.49) 2(18.8,9.49) 3(17.4,9.49) 4(16,9.49) 5(14.6,9.49) 6(13.2,9.49) 7(11.8,9.49) 8(10.4,9.49) 9(9,9.49) 10(7.6,9.49) 11(6.2,9.49) 12(4.8,9.49) 13(3.4,9.49) 14(2,9.49) 15(0.6,9.49) 16(-0.8,9.49) 17(-2.2,9.49) 18(-3.6,9.49) 19(-5,9.49) 20(-6.4,9.49) 21(-7.8,9.49) 22(-9.2,9.49) 23(-10.6,9.49) 34(-10.6,-8.91) 35(-9.2,-8.91) 36(-7.8,-8.91) 37(-6.4,-8.91) 38(-5,-8.91) 39(-3.6,-8.91) 40(-2.2,-8.91) 41(-0.8,-8.91) 42(0.6,-8.91) 43(2,-8.91) 44(3.4,-8.91) 45(4.8,-8.91) 46(6.2,-8.91) 47(7.6,-8.91) 48(9,-8.91) 49(10.4,-8.91) 50(11.8,-8.91) 51(13.2,-8.91) 52(14.6,-8.91) 53(16,-8.91) 54(17.4,-8.91) 55(18.8,-8.91) 56(20.2,-8.91)
  rect 1.6x0.9 smd: 24(-11.8,6.59) 25(-11.8,5.19) 26(-11.8,3.79) 27(-11.8,2.39) 28(-11.8,0.99) 29(-11.8,-0.41) 30(-11.8,-1.81) 31(-11.8,-3.21) 32(-11.8,-4.61) 33(-11.8,-6.01)
  rect 3x1.5 smd: 57(15.4,-2.31) 58(15.4,4.29)
  rect 5x5 smd: 59(0.134,-0.01)
Top Overlay:
  circle w0.15: c20.454,11.014 r0.359
  lines w0.1: -11.931,-6.639 -11.931,-9.052 -11.296,-9.052 ; -11.931,7.219 -11.931,9.632 -11.296,9.632 ; 20.896,-9.067 21.531,-9.067 21.531,9.632 20.896,9.632
3D body: height 1, standoff 0, extent -11.95,-9.075 21.525,9.65
3D body "User Library-1909763-1.STEP": height 2, standoff 0.72, extent -11.873,6.65 -9.023,9.65

## MX1.25-4PIN [mm]
pads (4):
  rect 1x1 hole 0.5: 1(0,0)
  round 1 hole 0.5: 2(1.25,0) 3(2.5,0) 4(3.75,0)
Top Overlay:
  lines w0.2: -1.614,-3.683 5.364,-3.683 ; -1.614,-4.191 -1.614,0.85 5.364,0.85 5.364,-4.191 -1.614,-4.191 ; -0.217,-2.667 1.307,-2.667 1.307,-1.016 -0.217,-1.016 -0.217,-2.667 ; 2.443,-2.667 3.967,-2.667 3.967,-1.016 2.443,-1.016 2.443,-2.667
Mechanical 15:
  circle w0.05: c1.875,0 r0.35
  lines w0.05: 1.375,0 2.375,0 ; 1.875,-0.5 1.875,0.5
3D body "MOLEX1.25-WI-4P.STEP": height 3.35, standoff -2.1, extent -1.5,-4.05 5.25,0.85

## NRF24L10 [mil]
pads (8):
  rect 65x65 hole 34: 1(-44,149)
  round 65 hole 34: 2(-44,49) 3(-44,-51) 4(-44,-151) 5(56,-151) 6(56,-51) 7(56,49) 8(56,149)
Top Overlay:
  lines w10: -1028,-209 -1028,381.55 113.73,381.55 113.73,-209 -1028,-209
3D body "User Library-NRF24L01.STEP": height 137.8, standoff -352.42, extent -1028,-209 113.73,381.55

## PIC16F1823 - 贴片转直插 [mil]
pads (14):
  rect 80x80 hole 35.43: 1(0,0)
  round 80 hole 35.43: 2(0,-100) 3(0,-200) 4(0,-300) 5(0,-400) 6(0,-500) 7(0,-600) 8(865,-600) 9(865,-500) 10(865,-400) 11(865,-300) 12(865,-200) 13(865,-100) 14(865,0)
Top Overlay:
  lines w10: -85,-685 955,-685 960,-680 960,70 -85,70 -85,-685
Bottom Overlay:
  lines w7.87: -50,-650 -50,50 50,50 50,-650 -50,-650 ; 815,-650 915,-650 915,50 815,50 815,-650

## QFN-28 [mm] "CP2102  USB转串口芯片"
pads (29):
  rect 3.13x3.13 smd mask+0.051: 0(1.909,-1.918)
  oval 0.85x0.28 smd mask+0.051: 1(-0.516,-0.418) 2(-0.516,-0.918) 3(-0.516,-1.418) 4(-0.516,-1.918) 5(-0.516,-2.418) 6(-0.516,-2.918) 7(-0.516,-3.418) 15(4.334,-3.418) 16(4.334,-2.918) 17(4.334,-2.418) 18(4.334,-1.918) 19(4.334,-1.418) 20(4.334,-0.918) 21(4.334,-0.418)
  oval 0.28x0.85 smd mask+0.051: 8(0.409,-4.343) 9(0.909,-4.343) 10(1.409,-4.343) 11(1.909,-4.343) 12(2.409,-4.343) 13(2.909,-4.343) 14(3.409,-4.343) 22(3.409,0.507) 23(2.909,0.507) 24(2.409,0.507) 25(1.909,0.507) 26(1.409,0.507) 27(0.909,0.507) 28(0.409,0.507)
Top Overlay:
  circle w0.3: c-1.241,0.532 r0.15
  lines w0.2: -0.741,-3.918 -0.741,-4.568 -0.091,-4.568 ; -0.741,0.082 -0.741,0.732 -0.091,0.732 ; 3.909,-4.568 4.559,-4.568 4.559,-3.918 ; 3.909,0.732 4.559,0.732 4.559,0.082
Mechanical 13:
  circle w0.1: c0.009,-0.018 r0.3
  lines w0.1: -0.591,-4.418 -0.591,0.582 4.409,0.582 4.409,-4.418 -0.591,-4.418
3D body "User Library-QFN28-0_5.STEP": height 1, standoff 0, extent -0.578,-4.416 4.422,0.584